# Altium footprint library mastermind.PCBLIB: 1061 footprints (part 4 of 67)
Each footprint in its own frame and in the unit in brackets; x right, y up, seen from the top. Pads: shape width x height; smd on the part's side, far side on the other; paste and mask are expansions set on the pad; w line width, h text height; cw(c..) or ccw(c..) is an arc to the next point about the centre after c.
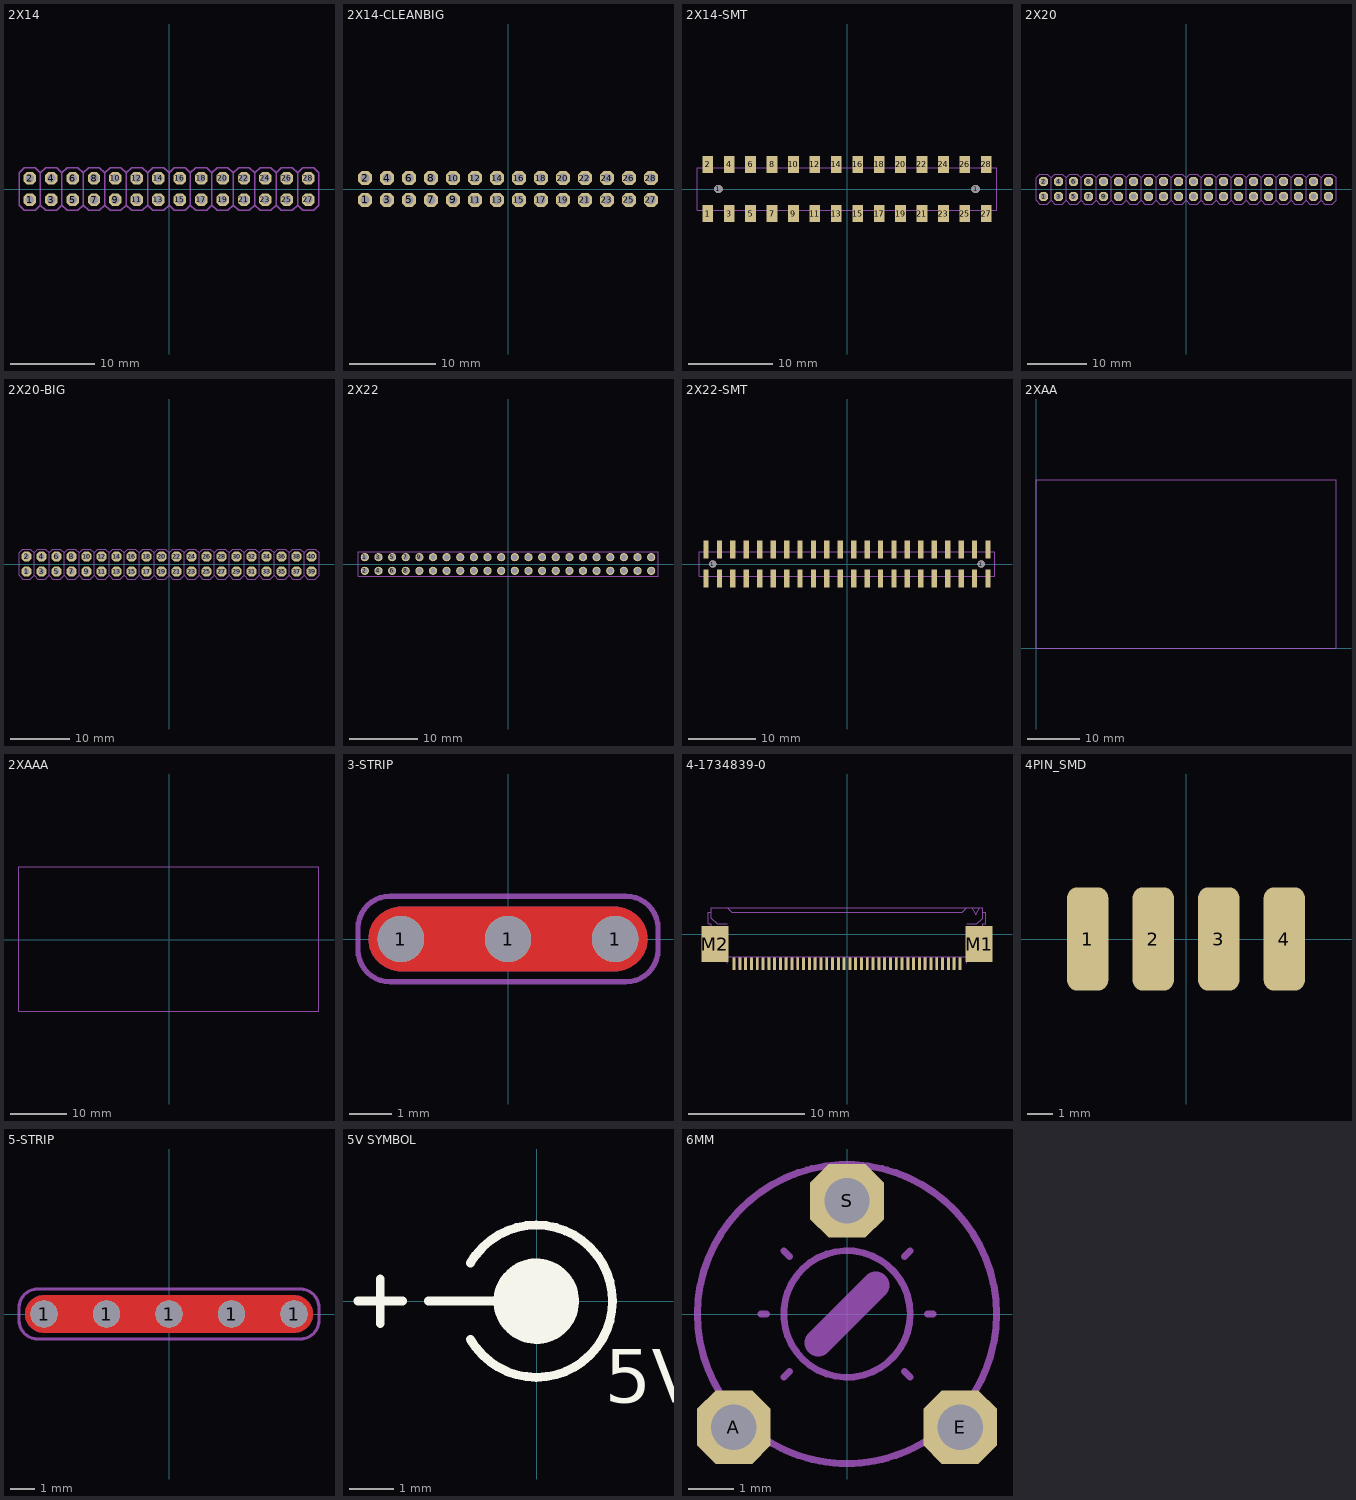
[diagram p3: the footprints below, top view; thin cyan lines are the x and y axes]

## 2X14 [mil]
pads (28):
  oct 58.09x58.09 hole 40: 1(-650,-50) 2(-650,50) 3(-550,-50) 4(-550,50) 5(-450,-50) 6(-450,50) 7(-350,-50) 8(-350,50) 9(-250,-50) 10(-250,50) 11(-150,-50) 12(-150,50) 13(-50,-50) 14(-50,50) 15(50,-50) 16(50,50) 17(150,-50) 18(150,50) 19(250,-50) 20(250,50) 21(350,-50) 22(350,50) 23(450,-50) 24(450,50) 25(550,-50) 26(550,50) 27(650,-50) 28(650,50)
Mechanical 2:
  lines w6: -600,-75 -625,-100 -675,-100 -700,-75 -700,75 -675,100 -625,100 -600,75 ; -600,-75 -575,-100 -525,-100 -500,-75 ; -600,-75 -600,75 ; -600,75 -575,100 -525,100 -500,75 ; -500,-75 -475,-100 -425,-100 -400,-75 ; -500,-75 -500,75 ; -500,75 -475,100 -425,100 -400,75 ; -400,-75 -375,-100 -325,-100 -300,-75 ; -400,-75 -400,75 ; -400,75 -375,100 -325,100 -300,75 ; -300,-75 -275,-100 -225,-100 -200,-75 ; -300,-75 -300,75 ; -300,75 -275,100 -225,100 -200,75 ; -200,-75 -175,-100 -125,-100 -100,-75 ; -200,-75 -200,75 ; -200,75 -175,100 -125,100 -100,75 ; -100,-75 -75,-100 -25,-100 0,-75 ; -100,-75 -100,75 ; -100,75 -75,100 -25,100 0,75 ; 0,-75 25,-100 75,-100 100,-75 ; 0,-75 0,75 ; 0,75 25,100 75,100 100,75 ; 100,-75 125,-100 175,-100 200,-75 ; 100,-75 100,75 ; 100,75 125,100 175,100 200,75 ; 200,-75 225,-100 275,-100 300,-75 ; 200,-75 200,75 ; 200,75 225,100 275,100 300,75 ; 300,-75 325,-100 375,-100 400,-75 ; 300,-75 300,75 ; 300,75 325,100 375,100 400,75 ; 400,-75 425,-100 475,-100 500,-75 ; 400,-75 400,75 ; 400,75 425,100 475,100 500,75 ; 500,-75 525,-100 575,-100 600,-75 ; 500,-75 500,75 ; 500,75 525,100 575,100 600,75 ; 600,-75 600,75 ; 600,-75 625,-100 675,-100 700,-75 700,75 675,100 625,100 600,75
Mechanical 8:
  region: -660,-60 -660,-40 -640,-40 -640,-60
  region: -660,40 -660,60 -640,60 -640,40
  region: -560,40 -560,60 -540,60 -540,40
  region: -560,-60 -560,-40 -540,-40 -540,-60
  region: -460,40 -460,60 -440,60 -440,40
  region: -460,-60 -460,-40 -440,-40 -440,-60
  region: -360,40 -360,60 -340,60 -340,40
  region: -260,40 -260,60 -240,60 -240,40
  region: -160,40 -160,60 -140,60 -140,40
  region: -360,-60 -360,-40 -340,-40 -340,-60
  region: -260,-60 -260,-40 -240,-40 -240,-60
  region: -160,-60 -160,-40 -140,-40 -140,-60
  region: -60,40 -60,60 -40,60 -40,40
  region: -60,-60 -60,-40 -40,-40 -40,-60
  region: 40,40 40,60 60,60 60,40
  region: 40,-60 40,-40 60,-40 60,-60
  region: 140,40 140,60 160,60 160,40
  region: 140,-60 140,-40 160,-40 160,-60
  region: 240,40 240,60 260,60 260,40
  region: 240,-60 240,-40 260,-40 260,-60
  region: 340,40 340,60 360,60 360,40
  region: 340,-60 340,-40 360,-40 360,-60
  region: 440,40 440,60 460,60 460,40
  region: 440,-60 440,-40 460,-40 460,-60
  region: 540,40 540,60 560,60 560,40
  region: 540,-60 540,-40 560,-40 560,-60
  region: 640,40 640,60 660,60 660,40
  region: 640,-60 640,-40 660,-40 660,-60

## 2X14-CLEANBIG [mil]
pads (28):
  oct 63.9x63.9 hole 40: 1(-650,-50) 2(-650,50) 3(-550,-50) 4(-550,50) 5(-450,-50) 6(-450,50) 7(-350,-50) 8(-350,50) 9(-250,-50) 10(-250,50) 11(-150,-50) 12(-150,50) 13(-50,-50) 14(-50,50) 15(50,-50) 16(50,50) 17(150,-50) 18(150,50) 19(250,-50) 20(250,50) 21(350,-50) 22(350,50) 23(450,-50) 24(450,50) 25(550,-50) 26(550,50) 27(650,-50) 28(650,50)
Mechanical 8:
  region: 640,40 640,60 660,60 660,40
  region: 640,-60 640,-40 660,-40 660,-60
  region: 540,40 540,60 560,60 560,40
  region: 540,-60 540,-40 560,-40 560,-60
  region: 440,40 440,60 460,60 460,40
  region: 440,-60 440,-40 460,-40 460,-60
  region: 340,40 340,60 360,60 360,40
  region: 340,-60 340,-40 360,-40 360,-60
  region: 240,40 240,60 260,60 260,40
  region: 240,-60 240,-40 260,-40 260,-60
  region: 140,-60 140,-40 160,-40 160,-60
  region: 140,40 140,60 160,60 160,40
  region: 40,-60 40,-40 60,-40 60,-60
  region: 40,40 40,60 60,60 60,40
  region: -60,-60 -60,-40 -40,-40 -40,-60
  region: -60,40 -60,60 -40,60 -40,40
  region: -160,-60 -160,-40 -140,-40 -140,-60
  region: -260,-60 -260,-40 -240,-40 -240,-60
  region: -360,-60 -360,-40 -340,-40 -340,-60
  region: -160,40 -160,60 -140,60 -140,40
  region: -260,40 -260,60 -240,60 -240,40
  region: -360,40 -360,60 -340,60 -340,40
  region: -460,-60 -460,-40 -440,-40 -440,-60
  region: -460,40 -460,60 -440,60 -440,40
  region: -560,-60 -560,-40 -540,-40 -540,-60
  region: -560,40 -560,60 -540,60 -540,40
  region: -660,40 -660,60 -640,60 -640,40
  region: -660,-60 -660,-40 -640,-40 -640,-60

## 2X14-SMT [mil]
pads (30):
  rect 50x80 smd: 1(-650,-115) 2(-650,115) 3(-550,-115) 4(-550,115) 5(-450,-115) 6(-450,115) 7(-350,-115) 8(-350,115) 9(-250,-115) 10(-250,115) 11(-150,-115) 12(-150,115) 13(-50,-115) 14(-50,115) 15(50,-115) 16(50,115) 17(150,-115) 18(150,115) 19(250,-115) 20(250,115) 21(350,-115) 22(350,115) 23(450,-115) 24(450,115) 25(550,-115) 26(550,115) 27(650,-115) 28(650,115)
  round 39.37 hole 39.37: 1(-600,0) 1(600,0)
Mechanical 2:
  lines w5: -700,-100 700,-100 700,100 -700,100 -700,-100

## 2X20 [mil]
pads (40):
  oct 58.09x58.09 hole 40: 1(-950,-50) 2(-950,50) 3(-850,-50) 4(-850,50) 5(-750,-50) 6(-750,50) 7(-650,-50) 8(-650,50) 9(-550,-50) 10(-550,50) 11(-450,-50) 12(-450,50) 13(-350,-50) 14(-350,50) 15(-250,-50) 16(-250,50) 17(-150,-50) 18(-150,50) 19(-50,-50) 20(-50,50) 21(50,-50) 22(50,50) 23(150,-50) 24(150,50) 25(250,-50) 26(250,50) 27(350,-50) 28(350,50) 29(450,-50) 30(450,50) 31(550,-50) 32(550,50) 33(650,-50) 34(650,50) 35(750,-50) 36(750,50) 37(850,-50) 38(850,50) 39(950,-50) 40(950,50)
Mechanical 2:
  lines w6: -900,-75 -925,-100 -975,-100 -1000,-75 -1000,75 -975,100 -925,100 -900,75 ; -900,-75 -875,-100 -825,-100 -800,-75 ; -900,-75 -900,75 ; -900,75 -875,100 -825,100 -800,75 ; -800,-75 -775,-100 -725,-100 -700,-75 ; -800,-75 -800,75 ; -800,75 -775,100 -725,100 -700,75 ; -700,-75 -675,-100 -625,-100 -600,-75 ; -700,-75 -700,75 ; -700,75 -675,100 -625,100 -600,75 ; -600,-75 -575,-100 -525,-100 -500,-75 ; -600,-75 -600,75 ; -600,75 -575,100 -525,100 -500,75 ; -500,-75 -475,-100 -425,-100 -400,-75 ; -500,-75 -500,75 ; -500,75 -475,100 -425,100 -400,75 ; -400,-75 -375,-100 -325,-100 -300,-75 ; -400,-75 -400,75 ; -400,75 -375,100 -325,100 -300,75 ; -300,-75 -275,-100 -225,-100 -200,-75 ; -300,-75 -300,75 ; -300,75 -275,100 -225,100 -200,75 ; -200,-75 -175,-100 -125,-100 -100,-75 ; -200,-75 -200,75 ; -200,75 -175,100 -125,100 -100,75 ; -100,-75 -75,-100 -25,-100 0,-75 ; -100,-75 -100,75 ; -100,75 -75,100 -25,100 0,75 ; 0,-75 25,-100 75,-100 100,-75 ; 0,-75 0,75 ; 0,75 25,100 75,100 100,75 ; 100,-75 125,-100 175,-100 200,-75 ; 100,-75 100,75 ; 100,75 125,100 175,100 200,75 ; 200,-75 225,-100 275,-100 300,-75 ; 200,-75 200,75 ; 200,75 225,100 275,100 300,75 ; 300,-75 325,-100 375,-100 400,-75 ; 300,-75 300,75 ; 300,75 325,100 375,100 400,75 ; 400,-75 425,-100 475,-100 500,-75 ; 400,-75 400,75 ; 400,75 425,100 475,100 500,75 ; 500,-75 525,-100 575,-100 600,-75 ; 500,-75 500,75 ; 500,75 525,100 575,100 600,75 ; 600,-75 625,-100 675,-100 700,-75 ; 600,-75 600,75 ; 600,75 625,100 675,100 700,75 ; 700,-75 725,-100 775,-100 800,-75 ; 700,-75 700,75 ; 700,75 725,100 775,100 800,75 ; 800,-75 825,-100 875,-100 900,-75 ; 800,-75 800,75 ; 800,75 825,100 875,100 900,75 ; 900,-75 900,75 ; 900,-75 925,-100 975,-100 1000,-75 1000,75 975,100 925,100 900,75
Mechanical 8:
  drawing of 40 lines, arcs and shapes, not listed

## 2X20-BIG [mil]
pads (40):
  oct 67.78x67.78 hole 40: 1(-950,-50) 2(-950,50) 3(-850,-50) 4(-850,50) 5(-750,-50) 6(-750,50) 7(-650,-50) 8(-650,50) 9(-550,-50) 10(-550,50) 11(-450,-50) 12(-450,50) 13(-350,-50) 14(-350,50) 15(-250,-50) 16(-250,50) 17(-150,-50) 18(-150,50) 19(-50,-50) 20(-50,50) 21(50,-50) 22(50,50) 23(150,-50) 24(150,50) 25(250,-50) 26(250,50) 27(350,-50) 28(350,50) 29(450,-50) 30(450,50) 31(550,-50) 32(550,50) 33(650,-50) 34(650,50) 35(750,-50) 36(750,50) 37(850,-50) 38(850,50) 39(950,-50) 40(950,50)
Mechanical 2:
  lines w6: -900,-75 -925,-100 -975,-100 -1000,-75 -1000,75 -975,100 -925,100 -900,75 ; -900,-75 -875,-100 -825,-100 -800,-75 ; -900,-75 -900,75 ; -900,75 -875,100 -825,100 -800,75 ; -800,-75 -775,-100 -725,-100 -700,-75 ; -800,-75 -800,75 ; -800,75 -775,100 -725,100 -700,75 ; -700,-75 -675,-100 -625,-100 -600,-75 ; -700,-75 -700,75 ; -700,75 -675,100 -625,100 -600,75 ; -600,-75 -575,-100 -525,-100 -500,-75 ; -600,-75 -600,75 ; -600,75 -575,100 -525,100 -500,75 ; -500,-75 -475,-100 -425,-100 -400,-75 ; -500,-75 -500,75 ; -500,75 -475,100 -425,100 -400,75 ; -400,-75 -375,-100 -325,-100 -300,-75 ; -400,-75 -400,75 ; -400,75 -375,100 -325,100 -300,75 ; -300,-75 -275,-100 -225,-100 -200,-75 ; -300,-75 -300,75 ; -300,75 -275,100 -225,100 -200,75 ; -200,-75 -175,-100 -125,-100 -100,-75 ; -200,-75 -200,75 ; -200,75 -175,100 -125,100 -100,75 ; -100,-75 -75,-100 -25,-100 0,-75 ; -100,-75 -100,75 ; -100,75 -75,100 -25,100 0,75 ; 0,-75 25,-100 75,-100 100,-75 ; 0,-75 0,75 ; 0,75 25,100 75,100 100,75 ; 100,-75 125,-100 175,-100 200,-75 ; 100,-75 100,75 ; 100,75 125,100 175,100 200,75 ; 200,-75 225,-100 275,-100 300,-75 ; 200,-75 200,75 ; 200,75 225,100 275,100 300,75 ; 300,-75 325,-100 375,-100 400,-75 ; 300,-75 300,75 ; 300,75 325,100 375,100 400,75 ; 400,-75 425,-100 475,-100 500,-75 ; 400,-75 400,75 ; 400,75 425,100 475,100 500,75 ; 500,-75 525,-100 575,-100 600,-75 ; 500,-75 500,75 ; 500,75 525,100 575,100 600,75 ; 600,-75 625,-100 675,-100 700,-75 ; 600,-75 600,75 ; 600,75 625,100 675,100 700,75 ; 700,-75 725,-100 775,-100 800,-75 ; 700,-75 700,75 ; 700,75 725,100 775,100 800,75 ; 800,-75 825,-100 875,-100 900,-75 ; 800,-75 800,75 ; 800,75 825,100 875,100 900,75 ; 900,-75 900,75 ; 900,-75 925,-100 975,-100 1000,-75 1000,75 975,100 925,100 900,75
Mechanical 8:
  drawing of 40 lines, arcs and shapes, not listed

## 2X22 [mm]
pads (44):
  round 1.2 hole 0.8: 1(-21,1) 2(-21,-1) 3(-19,1) 4(-19,-1) 5(-17,1) 6(-17,-1) 7(-15,1) 8(-15,-1) 9(-13,1) 10(-13,-1) 11(-11,1) 12(-11,-1) 13(-9,1) 14(-9,-1) 15(-7,1) 16(-7,-1) 17(-5,1) 18(-5,-1) 19(-3,1) 20(-3,-1) 21(-1,1) 22(-1,-1) 23(1,1) 24(1,-1) 25(3,1) 26(3,-1) 27(5,1) 28(5,-1) 29(7,1) 30(7,-1) 31(9,1) 32(9,-1) 33(11,1) 34(11,-1) 35(13,1) 36(13,-1) 37(15,1) 38(15,-1) 39(17,1) 40(17,-1) 41(19,1) 42(19,-1) 43(21,1) 44(21,-1)
Mechanical 2:
  lines w0.127: -22,-1.81 -22,1.81 22,1.81 22,-1.81 -22,-1.81

## 2X22-SMT [mil]
pads (46):
  rect 31.5x106.3 smd: 1(-826.77,84.65) 2(-826.77,-84.65) 3(-748.03,84.65) 4(-748.03,-84.65) 5(-669.29,84.65) 6(-669.29,-84.65) 7(-590.55,84.65) 8(-590.55,-84.65) 9(-511.81,84.65) 10(-511.81,-84.65) 11(-433.07,84.65) 12(-433.07,-84.65) 13(-354.33,84.65) 14(-354.33,-84.65) 15(-275.59,84.65) 16(-275.59,-84.65) 17(-196.85,84.65) 18(-196.85,-84.65) 19(-118.11,84.65) 20(-118.11,-84.65) 21(-39.37,84.65) 22(-39.37,-84.65) 23(39.37,84.65) 24(39.37,-84.65) 25(118.11,84.65) 26(118.11,-84.65) 27(196.85,84.65) 28(196.85,-84.65) 29(275.59,84.65) 30(275.59,-84.65) 31(354.33,84.65) 32(354.33,-84.65) 33(433.07,84.65) 34(433.07,-84.65) 35(511.81,84.65) 36(511.81,-84.65) 37(590.55,84.65) 38(590.55,-84.65) 39(669.29,84.65) 40(669.29,-84.65) 41(748.03,84.65) 42(748.03,-84.65) 43(826.77,84.65) 44(826.77,-84.65)
  round 43.31 hole 43.31: 1(-787.4,0) 1(787.4,0)
Mechanical 2:
  lines w5: -866.14,-71.26 -866.14,71.26 866.14,71.26 866.14,-71.26 -866.14,-71.26

## 2XAA [mm]
Mechanical 2:
  lines w0.127: 0,0 57.1,0 57.1,32 0,32 0,0

## 2XAAA [mm]
Mechanical 2:
  lines w0.127: -26.67,-12.7 -26.67,12.95 26.62,12.95 26.62,-12.7 -26.67,-12.7

## 2XAAA-SIDE [mm]

## 3-STRIP [mm]
pads (3):
  round 1.1 hole 1.1: 1(-2.54,0) 1(0,0) 1(2.54,0)
Top Layer:
  region: -3.302,0 -3.302,0.075 -3.273,0.222 -3.215,0.361 -3.132,0.486 -3.026,0.592 -2.901,0.675 -2.762,0.733 -2.615,0.762 -2.54,0.762 2.54,0.762 2.615,0.762 2.762,0.733 2.901,0.675 3.026,0.592 3.132,0.486 3.215,0.361 3.273,0.222 3.302,0.075 3.302,0 3.302,-0.075 3.273,-0.222 3.215,-0.361 3.132,-0.486 3.026,-0.592 2.901,-0.675 2.762,-0.733 2.615,-0.762 2.54,-0.762 -2.54,-0.762 -2.615,-0.762 -2.762,-0.733 -2.901,-0.675 -3.026,-0.592 -3.132,-0.486 -3.215,-0.361 -3.273,-0.222 -3.302,-0.075
Bottom Layer:
  region: 3.302,0 3.302,0.075 3.273,0.222 3.215,0.361 3.132,0.486 3.026,0.592 2.901,0.675 2.762,0.733 2.615,0.762 2.54,0.762 -2.54,0.762 -2.615,0.762 -2.762,0.733 -2.901,0.675 -3.026,0.592 -3.132,0.486 -3.215,0.361 -3.273,0.222 -3.302,0.075 -3.302,0 -3.302,-0.075 -3.273,-0.222 -3.215,-0.361 -3.132,-0.486 -3.026,-0.592 -2.901,-0.675 -2.762,-0.733 -2.615,-0.762 -2.54,-0.762 2.54,-0.762 2.615,-0.762 2.762,-0.733 2.901,-0.675 3.026,-0.592 3.132,-0.486 3.215,-0.361 3.273,-0.222 3.302,-0.075
Top Solder:
  region: -3.429,-0.127 -3.429,-0.202 -3.4,-0.349 -3.342,-0.488 -3.259,-0.613 -3.153,-0.719 -3.028,-0.802 -2.889,-0.86 -2.742,-0.889 -2.667,-0.889 2.667,-0.889 2.742,-0.889 2.889,-0.86 3.028,-0.802 3.153,-0.719 3.259,-0.613 3.342,-0.488 3.4,-0.349 3.429,-0.202 3.429,-0.127 3.429,0.127 3.429,0.202 3.4,0.349 3.342,0.488 3.259,0.613 3.153,0.719 3.028,0.802 2.889,0.86 2.742,0.889 2.667,0.889 -2.667,0.889 -2.742,0.889 -2.889,0.86 -3.028,0.802 -3.153,0.719 -3.259,0.613 -3.342,0.488 -3.4,0.349 -3.429,0.202 -3.429,0.127
Bottom Solder:
  region: 3.429,-0.127 3.429,-0.202 3.4,-0.349 3.342,-0.488 3.259,-0.613 3.153,-0.719 3.028,-0.802 2.889,-0.86 2.742,-0.889 2.667,-0.889 -2.667,-0.889 -2.742,-0.889 -2.889,-0.86 -3.028,-0.802 -3.153,-0.719 -3.259,-0.613 -3.342,-0.488 -3.4,-0.349 -3.429,-0.202 -3.429,-0.127 -3.429,0.127 -3.429,0.202 -3.4,0.349 -3.342,0.488 -3.259,0.613 -3.153,0.719 -3.028,0.802 -2.889,0.86 -2.742,0.889 -2.667,0.889 2.667,0.889 2.742,0.889 2.889,0.86 3.028,0.802 3.153,0.719 3.259,0.613 3.342,0.488 3.4,0.349 3.429,0.202 3.429,0.127
Mechanical 2:
  lines w0.127: -3.556,-0.254 ccw(c-2.794,-0.254) -2.794,-1.016 2.794,-1.016 ccw(c2.794,-0.254) 3.556,-0.254 3.556,0.254 ccw(c2.794,0.254) 2.794,1.016 -2.794,1.016 ccw(c-2.794,0.254) -3.556,0.254 -3.556,-0.254

## 4-1734839-0 [mm]
pads (42):
  rect 0.25x1.1 smd mask-0.55: 1(-9.75,-2.54) 2(-9.25,-2.54) 3(-8.75,-2.54) 4(-8.25,-2.54) 5(-7.75,-2.54) 6(-7.25,-2.54) 7(-6.75,-2.54) 8(-6.25,-2.54) 9(-5.75,-2.54) 10(-5.25,-2.54) 11(-4.75,-2.54) 12(-4.25,-2.54) 13(-3.75,-2.54) 14(-3.25,-2.54) 15(-2.75,-2.54) 16(-2.25,-2.54) 17(-1.75,-2.54) 18(-1.25,-2.54) 19(-0.75,-2.54) 20(-0.25,-2.54) 21(0.25,-2.54) 22(0.75,-2.54) 23(1.25,-2.54) 24(1.75,-2.54) 25(2.25,-2.54) 26(2.75,-2.54) 27(3.25,-2.54) 28(3.75,-2.54) 29(4.25,-2.54) 30(4.75,-2.54) 31(5.25,-2.54) 32(5.75,-2.54) 33(6.25,-2.54) 34(6.75,-2.54) 35(7.25,-2.54) 36(7.75,-2.54) 37(8.25,-2.54) 38(8.75,-2.54) 39(9.25,-2.54) 40(9.75,-2.54)
  rect 2.3x3.1 smd: M1(11.4,-0.84) M2(-11.4,-0.84)
Top Solder:
  drawing of 40 lines, arcs and shapes, not listed
Mechanical 2:
  lines w0.102: -11.7,2.26 -11.7,1.41 -11.2,0.91 -10.35,0.91 ; -11.7,2.31 -10.35,2.31 ; 10.35,0.91 11.2,0.91 11.7,1.41 11.7,2.26 ; 11.7,2.31 10.35,2.31 ; -10.35,2.31 10.35,2.31 ; -10.35,2.31 -9.95,1.91 9.95,1.91 10.35,2.31
Mechanical 8:
  drawing of 55 lines, arcs and shapes, not listed

## 4PIN_SMD [mm]
pads (4):
  rrect50% 1.6x4 smd: 1(-3.81,0) 2(-1.27,0) 3(1.27,0) 4(3.81,0)

## 5-STRIP [mm]
pads (5):
  round 1.1 hole 1.1: 1(-5.08,0) 1(-2.54,0) 1(0,0) 1(2.54,0) 1(5.08,0)
Top Layer:
  region: -5.842,0 -5.842,0.075 -5.813,0.222 -5.755,0.361 -5.672,0.486 -5.566,0.592 -5.441,0.675 -5.302,0.733 -5.155,0.762 -5.08,0.762 5.08,0.762 5.155,0.762 5.302,0.733 5.441,0.675 5.566,0.592 5.672,0.486 5.755,0.361 5.813,0.222 5.842,0.075 5.842,0 5.842,-0.075 5.813,-0.222 5.755,-0.361 5.672,-0.486 5.566,-0.592 5.441,-0.675 5.302,-0.733 5.155,-0.762 5.08,-0.762 -5.08,-0.762 -5.155,-0.762 -5.302,-0.733 -5.441,-0.675 -5.566,-0.592 -5.672,-0.486 -5.755,-0.361 -5.813,-0.222 -5.842,-0.075
Bottom Layer:
  region: 5.842,0 5.842,0.075 5.813,0.222 5.755,0.361 5.672,0.486 5.566,0.592 5.441,0.675 5.302,0.733 5.155,0.762 5.08,0.762 -5.08,0.762 -5.155,0.762 -5.302,0.733 -5.441,0.675 -5.566,0.592 -5.672,0.486 -5.755,0.361 -5.813,0.222 -5.842,0.075 -5.842,0 -5.842,-0.075 -5.813,-0.222 -5.755,-0.361 -5.672,-0.486 -5.566,-0.592 -5.441,-0.675 -5.302,-0.733 -5.155,-0.762 -5.08,-0.762 5.08,-0.762 5.155,-0.762 5.302,-0.733 5.441,-0.675 5.566,-0.592 5.672,-0.486 5.755,-0.361 5.813,-0.222 5.842,-0.075
Top Solder:
  region: -5.969,-0.127 -5.969,-0.202 -5.94,-0.349 -5.882,-0.488 -5.799,-0.613 -5.693,-0.719 -5.568,-0.802 -5.429,-0.86 -5.282,-0.889 -5.207,-0.889 5.207,-0.889 5.282,-0.889 5.429,-0.86 5.568,-0.802 5.693,-0.719 5.799,-0.613 5.882,-0.488 5.94,-0.349 5.969,-0.202 5.969,-0.127 5.969,0.127 5.969,0.202 5.94,0.349 5.882,0.488 5.799,0.613 5.693,0.719 5.568,0.802 5.429,0.86 5.282,0.889 5.207,0.889 -5.207,0.889 -5.282,0.889 -5.429,0.86 -5.568,0.802 -5.693,0.719 -5.799,0.613 -5.882,0.488 -5.94,0.349 -5.969,0.202 -5.969,0.127
Bottom Solder:
  region: 5.969,-0.127 5.969,-0.202 5.94,-0.349 5.882,-0.488 5.799,-0.613 5.693,-0.719 5.568,-0.802 5.429,-0.86 5.282,-0.889 5.207,-0.889 -5.207,-0.889 -5.282,-0.889 -5.429,-0.86 -5.568,-0.802 -5.693,-0.719 -5.799,-0.613 -5.882,-0.488 -5.94,-0.349 -5.969,-0.202 -5.969,-0.127 -5.969,0.127 -5.969,0.202 -5.94,0.349 -5.882,0.488 -5.799,0.613 -5.693,0.719 -5.568,0.802 -5.429,0.86 -5.282,0.889 -5.207,0.889 5.207,0.889 5.282,0.889 5.429,0.86 5.568,0.802 5.693,0.719 5.799,0.613 5.882,0.488 5.94,0.349 5.969,0.202 5.969,0.127
Mechanical 2:
  lines w0.127: -6.096,-0.254 ccw(c-5.334,-0.254) -5.334,-1.016 5.334,-1.016 ccw(c5.334,-0.254) 6.096,-0.254 6.096,0.254 ccw(c5.334,0.254) 5.334,1.016 -5.334,1.016 ccw(c-5.334,0.254) -6.096,0.254 -6.096,-0.254

## 5V SYMBOL [mm]
Top Overlay:
  circle w1: c-0.007,-0.002 r0.458
  lines w0.2: -4.007,-0.002 -3.007,-0.002 ; -3.507,-0.502 -3.507,0.498 ; -2.423,-0.002 -0.007,-0.002 ; -1.486,-0.856 ccw(c-0.007,-0.002) -1.486,0.853
  text "5V DC" at 1.524,-2.286 h1.2

## 6MM [mm]
pads (3):
  oct 1.623x1.623 hole 1: A(-2.5,-2.5) E(2.5,-2.5) S(0,2.5)
Mechanical 2:
  circle w0.152: c0,0 r1.397
  lines w0.152: -3.238,-0.648 ccw(c0,0) 0,-3.302 ccw(c0,0) 3.243,-0.624 ; -3.228,0.673 cw(c0,0) -0.889,3.175 ; -1.397,-1.397 -1.27,-1.27 ; -1.397,1.397 -1.27,1.27 ; 0.889,3.175 cw(c0,0) 3.228,0.673 ; 1.27,-1.27 1.397,-1.397 ; 1.27,1.27 1.397,1.397
  lines w0.61: -0.635,-0.635 0.635,0.635
Mechanical 8:
  circle w0.152: c0,0 r3.302
  lines w0.152: -1.905,0 -1.778,0 ; 0,1.778 0,1.905 ; 1.778,0 1.905,0